# Altium schematic symbol library jlcpcb_2025_04_capacitors_extended_1206.schlib: 2503 symbols (part 1 of 14)
Pins are listed as number, name and electrical type; pins without a type are passive.

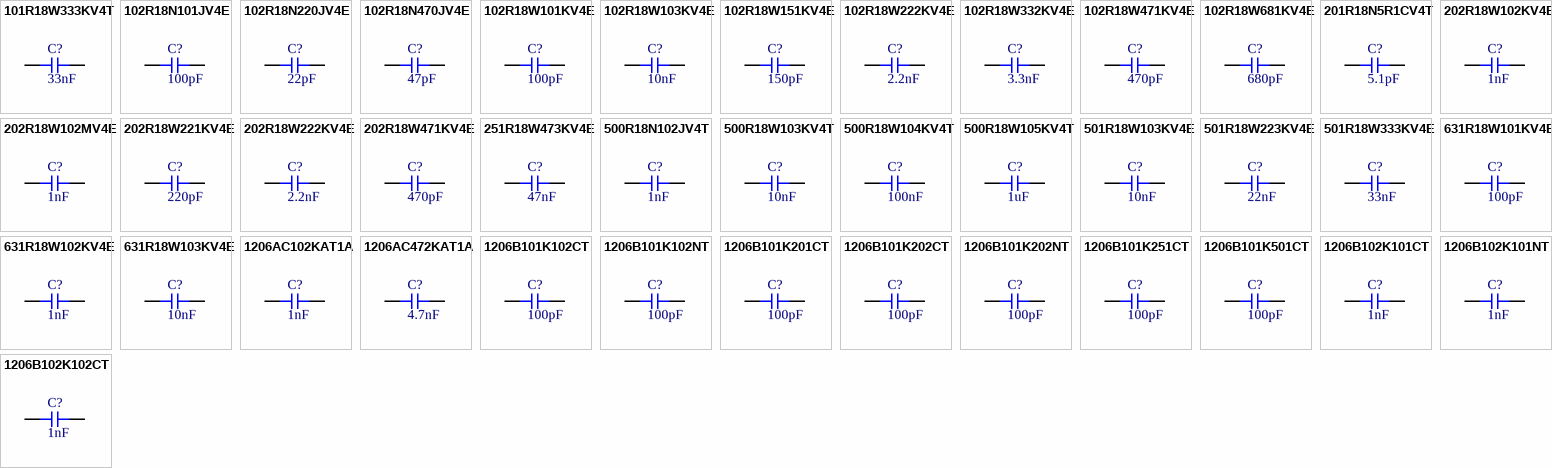
[diagram p0: symbols 101R18W333KV4T to 1206B102K102CT]

## 101R18W333KV4T
designator C?  Capacitance: 33nF  (hidden comment: *)
Capacitor, Ceramic (MLCC), 33nF, 100V, X7R, SMD 1206; Manufacturer: Johanson Dielectrics; Manufacturer Part Number: 101R18W333KV4T; Package Size: 1206; JLCPCB Basic Part: No; JLCPCB Part Number: C2917688; Supplier 1: LCSC; Category: Capacitors - MLCC; Supplier Part Number 1: C2917688; Voltage Rating: 100V; Temperature Coefficient: X7R; RoHS: Yes; ComponentLink1Description: Datasheet; ComponentLink1URL: https://wmsc.lcsc.com/wmsc/upload/file/pdf/v2/lcsc/2203311630_Johanson-Dielectrics-101R18W333KV4T_C2917688.pdf; ComponentLink2Description: JLCPCB Part URL; ComponentLink2URL: https://jlcpcb.com/partdetail/C2917688; ComponentLink3Description: LCSC Part URL; ComponentLink3URL: https://lcsc.com/product-detail/Multilayer-Ceramic-Capacitors-MLCC---SMD-SMT_Johanson-Dielectrics-Johanson-Dielectrics-101R18W333KV4T_C2917688.html
footprint CAP-1206 (1206 (3216M) Capacitor)
pins: 1, 2

## 102R18N101JV4E
designator C?  Capacitance: 100pF  (hidden comment: *)
Capacitor, Ceramic (MLCC), 100pF, ±5%, 1kV, C0G, ±5%, SMD 1206; Manufacturer: Johanson Dielectrics; Manufacturer Part Number: 102R18N101JV4E; Package Size: 1206; JLCPCB Basic Part: No; JLCPCB Part Number: C167435; Supplier 1: LCSC; Category: Capacitors - MLCC; Supplier Part Number 1: C167435; Tolerance: ±5%; Voltage Rating: 1kV; Temperature Coefficient: C0G; RoHS: Yes; ComponentLink1Description: Datasheet; ComponentLink1URL: https://wmsc.lcsc.com/wmsc/upload/file/pdf/v2/lcsc/2304140030_Johanson-Dielectrics-102R18N101JV4E_C167435.pdf; ComponentLink2Description: JLCPCB Part URL; ComponentLink2URL: https://jlcpcb.com/partdetail/C167435; ComponentLink3Description: LCSC Part URL; ComponentLink3URL: https://lcsc.com/product-detail/Multilayer-Ceramic-Capacitors-MLCC---SMD-SMT_Johanson-Dielectrics-Johanson-Dielectrics-102R18N101JV4E_C167435.html
footprint CAP-1206 (1206 (3216M) Capacitor)
pins: 1, 2

## 102R18N220JV4E
designator C?  Capacitance: 22pF  (hidden comment: *)
Capacitor, Ceramic (MLCC), 22pF, ±5%, 1kV, NP0, ±5%, SMD 1206; Manufacturer: Johanson Dielectrics; Manufacturer Part Number: 102R18N220JV4E; Package Size: 1206; JLCPCB Basic Part: No; JLCPCB Part Number: C173236; Supplier 1: LCSC; Category: Capacitors - MLCC; Supplier Part Number 1: C173236; Tolerance: ±5%; Voltage Rating: 1kV; Temperature Coefficient: NP0; RoHS: Yes; ComponentLink1Description: Datasheet; ComponentLink1URL: https://wmsc.lcsc.com/wmsc/upload/file/pdf/v2/lcsc/2304140030_Johanson-Dielectrics-102R18N220JV4E_C173236.pdf; ComponentLink2Description: JLCPCB Part URL; ComponentLink2URL: https://jlcpcb.com/partdetail/C173236; ComponentLink3Description: LCSC Part URL; ComponentLink3URL: https://lcsc.com/product-detail/Multilayer-Ceramic-Capacitors-MLCC---SMD-SMT_Johanson-Dielectrics-Johanson-Dielectrics-102R18N220JV4E_C173236.html
footprint CAP-1206 (1206 (3216M) Capacitor)
pins: 1, 2

## 102R18N470JV4E
designator C?  Capacitance: 47pF  (hidden comment: *)
Capacitor, Ceramic (MLCC), 47pF, ±5%, 1kV, NP0, ±5%, SMD 1206; Manufacturer: Johanson Dielectrics; Manufacturer Part Number: 102R18N470JV4E; Package Size: 1206; JLCPCB Basic Part: No; JLCPCB Part Number: C426616; Supplier 1: LCSC; Category: Capacitors - MLCC; Supplier Part Number 1: C426616; Tolerance: ±5%; Voltage Rating: 1kV; Temperature Coefficient: NP0; RoHS: Yes; ComponentLink1Description: Datasheet; ComponentLink1URL: https://wmsc.lcsc.com/wmsc/upload/file/pdf/v2/lcsc/2304140030_Johanson-Dielectrics-102R18N470JV4E_C426616.pdf; ComponentLink2Description: JLCPCB Part URL; ComponentLink2URL: https://jlcpcb.com/partdetail/C426616; ComponentLink3Description: LCSC Part URL; ComponentLink3URL: https://lcsc.com/product-detail/Multilayer-Ceramic-Capacitors-MLCC---SMD-SMT_Johanson-Dielectrics-Johanson-Dielectrics-102R18N470JV4E_C426616.html
footprint CAP-1206 (1206 (3216M) Capacitor)
pins: 1, 2

## 102R18W101KV4E
designator C?  Capacitance: 100pF  (hidden comment: *)
Capacitor, Ceramic (MLCC), 100pF, ±10%, 1kV, X7R, ±10%, SMD 1206; Manufacturer: Johanson Dielectrics; Manufacturer Part Number: 102R18W101KV4E; Package Size: 1206; JLCPCB Basic Part: No; JLCPCB Part Number: C430890; Supplier 1: LCSC; Category: Capacitors - MLCC; Supplier Part Number 1: C430890; Tolerance: ±10%; Voltage Rating: 1kV; Temperature Coefficient: X7R; RoHS: Yes; ComponentLink1Description: Datasheet; ComponentLink1URL: https://wmsc.lcsc.com/wmsc/upload/file/pdf/v2/lcsc/2304140030_Johanson-Dielectrics-102R18W101KV4E_C430890.pdf; ComponentLink2Description: JLCPCB Part URL; ComponentLink2URL: https://jlcpcb.com/partdetail/C430890; ComponentLink3Description: LCSC Part URL; ComponentLink3URL: https://lcsc.com/product-detail/Multilayer-Ceramic-Capacitors-MLCC---SMD-SMT_Johanson-Dielectrics-Johanson-Dielectrics-102R18W101KV4E_C430890.html
footprint CAP-1206 (1206 (3216M) Capacitor)
pins: 1, 2

## 102R18W103KV4E
designator C?  Capacitance: 10nF  (hidden comment: *)
Capacitor, Ceramic (MLCC), 10nF, ±10%, 1kV, X7R, ±10%, SMD 1206; Manufacturer: Johanson Dielectrics; Manufacturer Part Number: 102R18W103KV4E; Package Size: 1206; JLCPCB Basic Part: No; JLCPCB Part Number: C430993; Supplier 1: LCSC; Category: Capacitors - MLCC; Supplier Part Number 1: C430993; Tolerance: ±10%; Voltage Rating: 1kV; Temperature Coefficient: X7R; RoHS: Yes; ComponentLink1Description: Datasheet; ComponentLink1URL: https://wmsc.lcsc.com/wmsc/upload/file/pdf/v2/lcsc/2304140030_Johanson-Dielectrics-102R18W103KV4E_C430993.pdf; ComponentLink2Description: JLCPCB Part URL; ComponentLink2URL: https://jlcpcb.com/partdetail/C430993; ComponentLink3Description: LCSC Part URL; ComponentLink3URL: https://lcsc.com/product-detail/Multilayer-Ceramic-Capacitors-MLCC---SMD-SMT_Johanson-Dielectrics-Johanson-Dielectrics-102R18W103KV4E_C430993.html
footprint CAP-1206 (1206 (3216M) Capacitor)
pins: 1, 2

## 102R18W151KV4E
designator C?  Capacitance: 150pF  (hidden comment: *)
Capacitor, Ceramic (MLCC), 150pF, 1kV, X7R, SMD 1206; Manufacturer: Johanson Dielectrics; Manufacturer Part Number: 102R18W151KV4E; Package Size: 1206; JLCPCB Basic Part: No; JLCPCB Part Number: C2915790; Supplier 1: LCSC; Category: Capacitors - MLCC; Supplier Part Number 1: C2915790; Voltage Rating: 1kV; Temperature Coefficient: X7R; RoHS: Yes; ComponentLink1Description: Datasheet; ComponentLink1URL: https://wmsc.lcsc.com/wmsc/upload/file/pdf/v2/lcsc/2111161830_Johanson-Dielectrics-102R18W151KV4E_C2915790.pdf; ComponentLink2Description: JLCPCB Part URL; ComponentLink2URL: https://jlcpcb.com/partdetail/C2915790; ComponentLink3Description: LCSC Part URL; ComponentLink3URL: https://lcsc.com/product-detail/Multilayer-Ceramic-Capacitors-MLCC---SMD-SMT_Johanson-Dielectrics-Johanson-Dielectrics-102R18W151KV4E_C2915790.html
footprint CAP-1206 (1206 (3216M) Capacitor)
pins: 1, 2

## 102R18W222KV4E
designator C?  Capacitance: 2.2nF  (hidden comment: *)
Capacitor, Ceramic (MLCC), 2.2nF, ±10%, 1kV, X7R, ±10%, SMD 1206; Manufacturer: Johanson Dielectrics; Manufacturer Part Number: 102R18W222KV4E; Package Size: 1206; JLCPCB Basic Part: No; JLCPCB Part Number: C167434; Supplier 1: LCSC; Category: Capacitors - MLCC; Supplier Part Number 1: C167434; Tolerance: ±10%; Voltage Rating: 1kV; Temperature Coefficient: X7R; RoHS: Yes; ComponentLink1Description: Datasheet; ComponentLink1URL: https://wmsc.lcsc.com/wmsc/upload/file/pdf/v2/lcsc/2304140030_Johanson-Dielectrics-102R18W222KV4E_C167434.pdf; ComponentLink2Description: JLCPCB Part URL; ComponentLink2URL: https://jlcpcb.com/partdetail/C167434; ComponentLink3Description: LCSC Part URL; ComponentLink3URL: https://lcsc.com/product-detail/Multilayer-Ceramic-Capacitors-MLCC---SMD-SMT_Johanson-Dielectrics-Johanson-Dielectrics-102R18W222KV4E_C167434.html
footprint CAP-1206 (1206 (3216M) Capacitor)
pins: 1, 2

## 102R18W332KV4E
designator C?  Capacitance: 3.3nF  (hidden comment: *)
Capacitor, Ceramic (MLCC), 3.3nF, ±10%, 1kV, X7R, ±10%, SMD 1206; Manufacturer: Johanson Dielectrics; Manufacturer Part Number: 102R18W332KV4E; Package Size: 1206; JLCPCB Basic Part: No; JLCPCB Part Number: C427527; Supplier 1: LCSC; Category: Capacitors - MLCC; Supplier Part Number 1: C427527; Tolerance: ±10%; Voltage Rating: 1kV; Temperature Coefficient: X7R; RoHS: Yes; ComponentLink1Description: Datasheet; ComponentLink1URL: https://wmsc.lcsc.com/wmsc/upload/file/pdf/v2/lcsc/2304140030_Johanson-Dielectrics-102R18W332KV4E_C427527.pdf; ComponentLink2Description: JLCPCB Part URL; ComponentLink2URL: https://jlcpcb.com/partdetail/C427527; ComponentLink3Description: LCSC Part URL; ComponentLink3URL: https://lcsc.com/product-detail/Multilayer-Ceramic-Capacitors-MLCC---SMD-SMT_Johanson-Dielectrics-Johanson-Dielectrics-102R18W332KV4E_C427527.html
footprint CAP-1206 (1206 (3216M) Capacitor)
pins: 1, 2

## 102R18W471KV4E
designator C?  Capacitance: 470pF  (hidden comment: *)
Capacitor, Ceramic (MLCC), 470pF, ±10%, 1kV, X7R, ±10%, SMD 1206; Manufacturer: Johanson Dielectrics; Manufacturer Part Number: 102R18W471KV4E; Package Size: 1206; JLCPCB Basic Part: No; JLCPCB Part Number: C2915795; Supplier 1: LCSC; Category: Capacitors - MLCC; Supplier Part Number 1: C2915795; Tolerance: ±10%; Voltage Rating: 1kV; Temperature Coefficient: X7R; RoHS: Yes; ComponentLink1Description: Datasheet; ComponentLink1URL: https://wmsc.lcsc.com/wmsc/upload/file/pdf/v2/lcsc/2111161830_Johanson-Dielectrics-102R18W471KV4E_C2915795.pdf; ComponentLink2Description: JLCPCB Part URL; ComponentLink2URL: https://jlcpcb.com/partdetail/C2915795; ComponentLink3Description: LCSC Part URL; ComponentLink3URL: https://lcsc.com/product-detail/Multilayer-Ceramic-Capacitors-MLCC---SMD-SMT_Johanson-Dielectrics-Johanson-Dielectrics-102R18W471KV4E_C2915795.html
footprint CAP-1206 (1206 (3216M) Capacitor)
pins: 1, 2

## 102R18W681KV4E
designator C?  Capacitance: 680pF  (hidden comment: *)
Capacitor, Ceramic (MLCC), 680pF, ±10%, 1kV, X7R, ±10%, SMD 1206; Manufacturer: Johanson Dielectrics; Manufacturer Part Number: 102R18W681KV4E; Package Size: 1206; JLCPCB Basic Part: No; JLCPCB Part Number: C427526; Supplier 1: LCSC; Category: Capacitors - MLCC; Supplier Part Number 1: C427526; Tolerance: ±10%; Voltage Rating: 1kV; Temperature Coefficient: X7R; RoHS: Yes; ComponentLink1Description: Datasheet; ComponentLink1URL: https://wmsc.lcsc.com/wmsc/upload/file/pdf/v2/lcsc/2304140030_Johanson-Dielectrics-102R18W681KV4E_C427526.pdf; ComponentLink2Description: JLCPCB Part URL; ComponentLink2URL: https://jlcpcb.com/partdetail/C427526; ComponentLink3Description: LCSC Part URL; ComponentLink3URL: https://lcsc.com/product-detail/Multilayer-Ceramic-Capacitors-MLCC---SMD-SMT_Johanson-Dielectrics-Johanson-Dielectrics-102R18W681KV4E_C427526.html
footprint CAP-1206 (1206 (3216M) Capacitor)
pins: 1, 2

## 201R18N5R1CV4T
designator C?  Capacitance: 5.1pF  (hidden comment: *)
Capacitor, Ceramic (MLCC), 5.1pF, 200V, NP0, SMD 1206; Manufacturer: Johanson Dielectrics; Manufacturer Part Number: 201R18N5R1CV4T; Package Size: 1206; JLCPCB Basic Part: No; JLCPCB Part Number: C431011; Supplier 1: LCSC; Category: Capacitors - MLCC; Supplier Part Number 1: C431011; Voltage Rating: 200V; Temperature Coefficient: NP0; RoHS: Yes; ComponentLink1Description: Datasheet; ComponentLink1URL: https://wmsc.lcsc.com/wmsc/upload/file/pdf/v2/lcsc/2304140030_Johanson-Dielectrics-201R18N5R1CV4T_C431011.pdf; ComponentLink2Description: JLCPCB Part URL; ComponentLink2URL: https://jlcpcb.com/partdetail/C431011; ComponentLink3Description: LCSC Part URL; ComponentLink3URL: https://lcsc.com/product-detail/Multilayer-Ceramic-Capacitors-MLCC---SMD-SMT_Johanson-Dielectrics-Johanson-Dielectrics-201R18N5R1CV4T_C431011.html
footprint CAP-1206 (1206 (3216M) Capacitor)
pins: 1, 2

## 202R18W102KV4E
designator C?  Capacitance: 1nF  (hidden comment: *)
Capacitor, Ceramic (MLCC), 1nF, ±10%, 2kV, X7R, ±10%, SMD 1206; Manufacturer: Johanson Dielectrics; Manufacturer Part Number: 202R18W102KV4E; Package Size: 1206; JLCPCB Basic Part: No; JLCPCB Part Number: C173242; Supplier 1: LCSC; Category: Capacitors - MLCC; Supplier Part Number 1: C173242; Tolerance: ±10%; Voltage Rating: 2kV; Temperature Coefficient: X7R; RoHS: Yes; ComponentLink1Description: Datasheet; ComponentLink1URL: https://wmsc.lcsc.com/wmsc/upload/file/pdf/v2/lcsc/2304140030_Johanson-Dielectrics-202R18W102KV4E_C173242.pdf; ComponentLink2Description: JLCPCB Part URL; ComponentLink2URL: https://jlcpcb.com/partdetail/C173242; ComponentLink3Description: LCSC Part URL; ComponentLink3URL: https://lcsc.com/product-detail/Multilayer-Ceramic-Capacitors-MLCC---SMD-SMT_Johanson-Dielectrics-Johanson-Dielectrics-202R18W102KV4E_C173242.html
footprint CAP-1206 (1206 (3216M) Capacitor)
pins: 1, 2

## 202R18W102MV4E
designator C?  Capacitance: 1nF  (hidden comment: *)
Capacitor, Ceramic (MLCC), 1nF, ±20%, 2kV, X7R, ±20%, SMD 1206; Manufacturer: Johanson Dielectrics; Manufacturer Part Number: 202R18W102MV4E; Package Size: 1206; JLCPCB Basic Part: No; JLCPCB Part Number: C167433; Supplier 1: LCSC; Category: Capacitors - MLCC; Supplier Part Number 1: C167433; Tolerance: ±20%; Voltage Rating: 2kV; Temperature Coefficient: X7R; RoHS: Yes; ComponentLink1Description: Datasheet; ComponentLink1URL: https://wmsc.lcsc.com/wmsc/upload/file/pdf/v2/lcsc/2304140030_Johanson-Dielectrics-202R18W102MV4E_C167433.pdf; ComponentLink2Description: JLCPCB Part URL; ComponentLink2URL: https://jlcpcb.com/partdetail/C167433; ComponentLink3Description: LCSC Part URL; ComponentLink3URL: https://lcsc.com/product-detail/Multilayer-Ceramic-Capacitors-MLCC---SMD-SMT_Johanson-Dielectrics-Johanson-Dielectrics-202R18W102MV4E_C167433.html
footprint CAP-1206 (1206 (3216M) Capacitor)
pins: 1, 2

## 202R18W221KV4E
designator C?  Capacitance: 220pF  (hidden comment: *)
Capacitor, Ceramic (MLCC), 220pF, ±10%, 2kV, X7R, ±10%, SMD 1206; Manufacturer: Johanson Dielectrics; Manufacturer Part Number: 202R18W221KV4E; Package Size: 1206; JLCPCB Basic Part: No; JLCPCB Part Number: C173233; Supplier 1: LCSC; Category: Capacitors - MLCC; Supplier Part Number 1: C173233; Tolerance: ±10%; Voltage Rating: 2kV; Temperature Coefficient: X7R; RoHS: Yes; ComponentLink1Description: Datasheet; ComponentLink1URL: https://wmsc.lcsc.com/wmsc/upload/file/pdf/v2/lcsc/2304140030_Johanson-Dielectrics-202R18W221KV4E_C173233.pdf; ComponentLink2Description: JLCPCB Part URL; ComponentLink2URL: https://jlcpcb.com/partdetail/C173233; ComponentLink3Description: LCSC Part URL; ComponentLink3URL: https://lcsc.com/product-detail/Multilayer-Ceramic-Capacitors-MLCC---SMD-SMT_Johanson-Dielectrics-Johanson-Dielectrics-202R18W221KV4E_C173233.html
footprint CAP-1206 (1206 (3216M) Capacitor)
pins: 1, 2

## 202R18W222KV4E
designator C?  Capacitance: 2.2nF  (hidden comment: *)
Capacitor, Ceramic (MLCC), 2.2nF, ±10%, 2kV, X7R, ±10%, SMD 1206; Manufacturer: Johanson Dielectrics; Manufacturer Part Number: 202R18W222KV4E; Package Size: 1206; JLCPCB Basic Part: No; JLCPCB Part Number: C173213; Supplier 1: LCSC; Category: Capacitors - MLCC; Supplier Part Number 1: C173213; Tolerance: ±10%; Voltage Rating: 2kV; Temperature Coefficient: X7R; RoHS: Yes; ComponentLink1Description: Datasheet; ComponentLink1URL: https://wmsc.lcsc.com/wmsc/upload/file/pdf/v2/lcsc/2304140030_Johanson-Dielectrics-202R18W222KV4E_C173213.pdf; ComponentLink2Description: JLCPCB Part URL; ComponentLink2URL: https://jlcpcb.com/partdetail/C173213; ComponentLink3Description: LCSC Part URL; ComponentLink3URL: https://lcsc.com/product-detail/Multilayer-Ceramic-Capacitors-MLCC---SMD-SMT_Johanson-Dielectrics-Johanson-Dielectrics-202R18W222KV4E_C173213.html
footprint CAP-1206 (1206 (3216M) Capacitor)
pins: 1, 2

## 202R18W471KV4E
designator C?  Capacitance: 470pF  (hidden comment: *)
Capacitor, Ceramic (MLCC), 470pF, ±10%, 2kV, X7R, ±10%, SMD 1206; Manufacturer: Johanson Dielectrics; Manufacturer Part Number: 202R18W471KV4E; Package Size: 1206; JLCPCB Basic Part: No; JLCPCB Part Number: C167388; Supplier 1: LCSC; Category: Capacitors - MLCC; Supplier Part Number 1: C167388; Tolerance: ±10%; Voltage Rating: 2kV; Temperature Coefficient: X7R; RoHS: Yes; ComponentLink1Description: Datasheet; ComponentLink1URL: https://wmsc.lcsc.com/wmsc/upload/file/pdf/v2/lcsc/2304140030_Johanson-Dielectrics-202R18W471KV4E_C167388.pdf; ComponentLink2Description: JLCPCB Part URL; ComponentLink2URL: https://jlcpcb.com/partdetail/C167388; ComponentLink3Description: LCSC Part URL; ComponentLink3URL: https://lcsc.com/product-detail/Multilayer-Ceramic-Capacitors-MLCC---SMD-SMT_Johanson-Dielectrics-Johanson-Dielectrics-202R18W471KV4E_C167388.html
footprint CAP-1206 (1206 (3216M) Capacitor)
pins: 1, 2

## 251R18W473KV4E
designator C?  Capacitance: 47nF  (hidden comment: *)
Capacitor, Ceramic (MLCC), 47nF, ±10%, 250V, X7R, ±10%, SMD 1206; Manufacturer: Johanson Dielectrics; Manufacturer Part Number: 251R18W473KV4E; Package Size: 1206; JLCPCB Basic Part: No; JLCPCB Part Number: C173193; Supplier 1: LCSC; Category: Capacitors - MLCC; Supplier Part Number 1: C173193; Tolerance: ±10%; Voltage Rating: 250V; Temperature Coefficient: X7R; RoHS: Yes; ComponentLink1Description: Datasheet; ComponentLink1URL: https://wmsc.lcsc.com/wmsc/upload/file/pdf/v2/lcsc/2111161730_Johanson-Dielectrics-251R18W473KV4E_C173193.pdf; ComponentLink2Description: JLCPCB Part URL; ComponentLink2URL: https://jlcpcb.com/partdetail/C173193; ComponentLink3Description: LCSC Part URL; ComponentLink3URL: https://lcsc.com/product-detail/Multilayer-Ceramic-Capacitors-MLCC---SMD-SMT_Johanson-Dielectrics-Johanson-Dielectrics-251R18W473KV4E_C173193.html
footprint CAP-1206 (1206 (3216M) Capacitor)
pins: 1, 2

## 500R18N102JV4T
designator C?  Capacitance: 1nF  (hidden comment: *)
Capacitor, Ceramic (MLCC), 1nF, ±5%, 50V, NP0, ±5%, SMD 1206; Manufacturer: Johanson Dielectrics; Manufacturer Part Number: 500R18N102JV4T; Package Size: 1206; JLCPCB Basic Part: No; JLCPCB Part Number: C431634; Supplier 1: LCSC; Category: Capacitors - MLCC; Supplier Part Number 1: C431634; Tolerance: ±5%; Voltage Rating: 50V; Temperature Coefficient: NP0; RoHS: Yes; ComponentLink1Description: Datasheet; ComponentLink1URL: https://wmsc.lcsc.com/wmsc/upload/file/pdf/v2/lcsc/2304140030_Johanson-Dielectrics-500R18N102JV4T_C431634.pdf; ComponentLink2Description: JLCPCB Part URL; ComponentLink2URL: https://jlcpcb.com/partdetail/C431634; ComponentLink3Description: LCSC Part URL; ComponentLink3URL: https://lcsc.com/product-detail/Multilayer-Ceramic-Capacitors-MLCC---SMD-SMT_Johanson-Dielectrics-Johanson-Dielectrics-500R18N102JV4T_C431634.html
footprint CAP-1206 (1206 (3216M) Capacitor)
pins: 1, 2

## 500R18W103KV4T
designator C?  Capacitance: 10nF  (hidden comment: *)
Capacitor, Ceramic (MLCC), 10nF, ±10%, 50V, X7R, ±10%, SMD 1206; Manufacturer: Johanson Dielectrics; Manufacturer Part Number: 500R18W103KV4T; Package Size: 1206; JLCPCB Basic Part: No; JLCPCB Part Number: C431006; Supplier 1: LCSC; Category: Capacitors - MLCC; Supplier Part Number 1: C431006; Tolerance: ±10%; Voltage Rating: 50V; Temperature Coefficient: X7R; RoHS: Yes; ComponentLink1Description: Datasheet; ComponentLink1URL: https://wmsc.lcsc.com/wmsc/upload/file/pdf/v2/lcsc/2304140030_Johanson-Dielectrics-500R18W103KV4T_C431006.pdf; ComponentLink2Description: JLCPCB Part URL; ComponentLink2URL: https://jlcpcb.com/partdetail/C431006; ComponentLink3Description: LCSC Part URL; ComponentLink3URL: https://lcsc.com/product-detail/Multilayer-Ceramic-Capacitors-MLCC---SMD-SMT_Johanson-Dielectrics-Johanson-Dielectrics-500R18W103KV4T_C431006.html
footprint CAP-1206 (1206 (3216M) Capacitor)
pins: 1, 2

## 500R18W104KV4T
designator C?  Capacitance: 100nF  (hidden comment: *)
Capacitor, Ceramic (MLCC), 100nF, ±10%, 50V, X7R, ±10%, SMD 1206; Manufacturer: Johanson Dielectrics; Manufacturer Part Number: 500R18W104KV4T; Package Size: 1206; JLCPCB Basic Part: No; JLCPCB Part Number: C431007; Supplier 1: LCSC; Category: Capacitors - MLCC; Supplier Part Number 1: C431007; Tolerance: ±10%; Voltage Rating: 50V; Temperature Coefficient: X7R; RoHS: Yes; ComponentLink1Description: Datasheet; ComponentLink1URL: https://wmsc.lcsc.com/wmsc/upload/file/pdf/v2/lcsc/2304140030_Johanson-Dielectrics-500R18W104KV4T_C431007.pdf; ComponentLink2Description: JLCPCB Part URL; ComponentLink2URL: https://jlcpcb.com/partdetail/C431007; ComponentLink3Description: LCSC Part URL; ComponentLink3URL: https://lcsc.com/product-detail/Multilayer-Ceramic-Capacitors-MLCC---SMD-SMT_Johanson-Dielectrics-Johanson-Dielectrics-500R18W104KV4T_C431007.html
footprint CAP-1206 (1206 (3216M) Capacitor)
pins: 1, 2

## 500R18W105KV4T
designator C?  Capacitance: 1uF  (hidden comment: *)
Capacitor, Ceramic (MLCC), 1uF, 50V, X7R, SMD 1206; Manufacturer: Johanson Dielectrics; Manufacturer Part Number: 500R18W105KV4T; Package Size: 1206; JLCPCB Basic Part: No; JLCPCB Part Number: C2917761; Supplier 1: LCSC; Category: Capacitors - MLCC; Supplier Part Number 1: C2917761; Voltage Rating: 50V; Temperature Coefficient: X7R; RoHS: Yes; ComponentLink1Description: Datasheet; ComponentLink1URL: https://wmsc.lcsc.com/wmsc/upload/file/pdf/v2/lcsc/2203311630_Johanson-Dielectrics-500R18W105KV4T_C2917761.pdf; ComponentLink2Description: JLCPCB Part URL; ComponentLink2URL: https://jlcpcb.com/partdetail/C2917761; ComponentLink3Description: LCSC Part URL; ComponentLink3URL: https://lcsc.com/product-detail/Multilayer-Ceramic-Capacitors-MLCC---SMD-SMT_Johanson-Dielectrics-Johanson-Dielectrics-500R18W105KV4T_C2917761.html
footprint CAP-1206 (1206 (3216M) Capacitor)
pins: 1, 2

## 501R18W103KV4E
designator C?  Capacitance: 10nF  (hidden comment: *)
Capacitor, Ceramic (MLCC), 10nF, ±10%, 500V, X7R, ±10%, SMD 1206; Manufacturer: Johanson Dielectrics; Manufacturer Part Number: 501R18W103KV4E; Package Size: 1206; JLCPCB Basic Part: No; JLCPCB Part Number: C2168125; Supplier 1: LCSC; Category: Capacitors - MLCC; Supplier Part Number 1: C2168125; Tolerance: ±10%; Voltage Rating: 500V; Temperature Coefficient: X7R; RoHS: Yes; ComponentLink1Description: Datasheet; ComponentLink1URL: https://wmsc.lcsc.com/wmsc/upload/file/pdf/v2/lcsc/2304140030_Johanson-Dielectrics-501R18W103KV4E_C2168125.pdf; ComponentLink2Description: JLCPCB Part URL; ComponentLink2URL: https://jlcpcb.com/partdetail/C2168125; ComponentLink3Description: LCSC Part URL; ComponentLink3URL: https://lcsc.com/product-detail/Multilayer-Ceramic-Capacitors-MLCC---SMD-SMT_Johanson-Dielectrics-Johanson-Dielectrics-501R18W103KV4E_C2168125.html
footprint CAP-1206 (1206 (3216M) Capacitor)
pins: 1, 2

## 501R18W223KV4E
designator C?  Capacitance: 22nF  (hidden comment: *)
Capacitor, Ceramic (MLCC), 22nF, ±10%, 500V, X7R, ±10%, SMD 1206; Manufacturer: Johanson Dielectrics; Manufacturer Part Number: 501R18W223KV4E; Package Size: 1206; JLCPCB Basic Part: No; JLCPCB Part Number: C426618; Supplier 1: LCSC; Category: Capacitors - MLCC; Supplier Part Number 1: C426618; Tolerance: ±10%; Voltage Rating: 500V; Temperature Coefficient: X7R; RoHS: Yes; ComponentLink1Description: Datasheet; ComponentLink1URL: https://wmsc.lcsc.com/wmsc/upload/file/pdf/v2/lcsc/2304140030_Johanson-Dielectrics-501R18W223KV4E_C426618.pdf; ComponentLink2Description: JLCPCB Part URL; ComponentLink2URL: https://jlcpcb.com/partdetail/C426618; ComponentLink3Description: LCSC Part URL; ComponentLink3URL: https://lcsc.com/product-detail/Multilayer-Ceramic-Capacitors-MLCC---SMD-SMT_Johanson-Dielectrics-Johanson-Dielectrics-501R18W223KV4E_C426618.html
footprint CAP-1206 (1206 (3216M) Capacitor)
pins: 1, 2

## 501R18W333KV4E
designator C?  Capacitance: 33nF  (hidden comment: *)
Capacitor, Ceramic (MLCC), 33nF, ±10%, 500V, X7R, ±10%, SMD 1206; Manufacturer: Johanson Dielectrics; Manufacturer Part Number: 501R18W333KV4E; Package Size: 1206; JLCPCB Basic Part: No; JLCPCB Part Number: C427529; Supplier 1: LCSC; Category: Capacitors - MLCC; Supplier Part Number 1: C427529; Tolerance: ±10%; Voltage Rating: 500V; Temperature Coefficient: X7R; RoHS: Yes; ComponentLink1Description: Datasheet; ComponentLink1URL: https://wmsc.lcsc.com/wmsc/upload/file/pdf/v2/lcsc/2304140030_Johanson-Dielectrics-501R18W333KV4E_C427529.pdf; ComponentLink2Description: JLCPCB Part URL; ComponentLink2URL: https://jlcpcb.com/partdetail/C427529; ComponentLink3Description: LCSC Part URL; ComponentLink3URL: https://lcsc.com/product-detail/Multilayer-Ceramic-Capacitors-MLCC---SMD-SMT_Johanson-Dielectrics-Johanson-Dielectrics-501R18W333KV4E_C427529.html
footprint CAP-1206 (1206 (3216M) Capacitor)
pins: 1, 2

## 631R18W101KV4E
designator C?  Capacitance: 100pF  (hidden comment: *)
Capacitor, Ceramic (MLCC), 100pF, ±10%, 630V, X7R, ±10%, SMD 1206; Manufacturer: Johanson Dielectrics; Manufacturer Part Number: 631R18W101KV4E; Package Size: 1206; JLCPCB Basic Part: No; JLCPCB Part Number: C430889; Supplier 1: LCSC; Category: Capacitors - MLCC; Supplier Part Number 1: C430889; Tolerance: ±10%; Voltage Rating: 630V; Temperature Coefficient: X7R; RoHS: Yes; ComponentLink1Description: Datasheet; ComponentLink1URL: https://wmsc.lcsc.com/wmsc/upload/file/pdf/v2/lcsc/2304140030_Johanson-Dielectrics-631R18W101KV4E_C430889.pdf; ComponentLink2Description: JLCPCB Part URL; ComponentLink2URL: https://jlcpcb.com/partdetail/C430889; ComponentLink3Description: LCSC Part URL; ComponentLink3URL: https://lcsc.com/product-detail/Multilayer-Ceramic-Capacitors-MLCC---SMD-SMT_Johanson-Dielectrics-Johanson-Dielectrics-631R18W101KV4E_C430889.html
footprint CAP-1206 (1206 (3216M) Capacitor)
pins: 1, 2

## 631R18W102KV4E
designator C?  Capacitance: 1nF  (hidden comment: *)
Capacitor, Ceramic (MLCC), 1nF, ±10%, 630V, X7R, ±10%, SMD 1206; Manufacturer: Johanson Dielectrics; Manufacturer Part Number: 631R18W102KV4E; Package Size: 1206; JLCPCB Basic Part: No; JLCPCB Part Number: C430891; Supplier 1: LCSC; Category: Capacitors - MLCC; Supplier Part Number 1: C430891; Tolerance: ±10%; Voltage Rating: 630V; Temperature Coefficient: X7R; RoHS: Yes; ComponentLink1Description: Datasheet; ComponentLink1URL: https://wmsc.lcsc.com/wmsc/upload/file/pdf/v2/lcsc/2304140030_Johanson-Dielectrics-631R18W102KV4E_C430891.pdf; ComponentLink2Description: JLCPCB Part URL; ComponentLink2URL: https://jlcpcb.com/partdetail/C430891; ComponentLink3Description: LCSC Part URL; ComponentLink3URL: https://lcsc.com/product-detail/Multilayer-Ceramic-Capacitors-MLCC---SMD-SMT_Johanson-Dielectrics-Johanson-Dielectrics-631R18W102KV4E_C430891.html
footprint CAP-1206 (1206 (3216M) Capacitor)
pins: 1, 2

## 631R18W103KV4E
designator C?  Capacitance: 10nF  (hidden comment: *)
Capacitor, Ceramic (MLCC), 10nF, ±10%, 630V, X7R, ±10%, SMD 1206; Manufacturer: Johanson Dielectrics; Manufacturer Part Number: 631R18W103KV4E; Package Size: 1206; JLCPCB Basic Part: No; JLCPCB Part Number: C430992; Supplier 1: LCSC; Category: Capacitors - MLCC; Supplier Part Number 1: C430992; Tolerance: ±10%; Voltage Rating: 630V; Temperature Coefficient: X7R; RoHS: Yes; ComponentLink1Description: Datasheet; ComponentLink1URL: https://wmsc.lcsc.com/wmsc/upload/file/pdf/v2/lcsc/2304140030_Johanson-Dielectrics-631R18W103KV4E_C430992.pdf; ComponentLink2Description: JLCPCB Part URL; ComponentLink2URL: https://jlcpcb.com/partdetail/C430992; ComponentLink3Description: LCSC Part URL; ComponentLink3URL: https://lcsc.com/product-detail/Multilayer-Ceramic-Capacitors-MLCC---SMD-SMT_Johanson-Dielectrics-Johanson-Dielectrics-631R18W103KV4E_C430992.html
footprint CAP-1206 (1206 (3216M) Capacitor)
pins: 1, 2

## 1206AC102KAT1A
designator C?  Capacitance: 1nF  (hidden comment: *)
Capacitor, Ceramic (MLCC), 1nF, ±10%, 1kV, X7R, ±10%, SMD 1206; Manufacturer: AVX; Manufacturer Part Number: 1206AC102KAT1A; Package Size: 1206; JLCPCB Basic Part: No; JLCPCB Part Number: C597538; Supplier 1: LCSC; Category: Capacitors - MLCC; Supplier Part Number 1: C597538; Tolerance: ±10%; Voltage Rating: 1kV; Temperature Coefficient: X7R; RoHS: Yes; ComponentLink1Description: Datasheet; ComponentLink1URL: https://wmsc.lcsc.com/wmsc/upload/file/pdf/v2/lcsc/2304140030_Kyocera-AVX-1206AC102KAT1A_C597538.pdf; ComponentLink2Description: JLCPCB Part URL; ComponentLink2URL: https://jlcpcb.com/partdetail/C597538; ComponentLink3Description: LCSC Part URL; ComponentLink3URL: https://lcsc.com/product-detail/Multilayer-Ceramic-Capacitors-MLCC---SMD-SMT_Kyocera-AVX-Kyocera-AVX-1206AC102KAT1A_C597538.html
footprint CAP-1206 (1206 (3216M) Capacitor)
pins: 1, 2

## 1206AC472KAT1A
designator C?  Capacitance: 4.7nF  (hidden comment: *)
Capacitor, Ceramic (MLCC), 4.7nF, ±10%, 1kV, X7R, ±10%, SMD 1206; Manufacturer: Kyocera AVX; Manufacturer Part Number: 1206AC472KAT1A; Package Size: 1206; JLCPCB Basic Part: No; JLCPCB Part Number: C2167687; Supplier 1: LCSC; Category: Capacitors - MLCC; Supplier Part Number 1: C2167687; Tolerance: ±10%; Voltage Rating: 1kV; Temperature Coefficient: X7R; RoHS: Yes; ComponentLink1Description: Datasheet; ComponentLink1URL: https://wmsc.lcsc.com/wmsc/upload/file/pdf/v2/lcsc/2309151035_Kyocera-AVX-1206AC472KAT1A_C2167687.pdf; ComponentLink2Description: JLCPCB Part URL; ComponentLink2URL: https://jlcpcb.com/partdetail/C2167687; ComponentLink3Description: LCSC Part URL; ComponentLink3URL: https://lcsc.com/product-detail/Multilayer-Ceramic-Capacitors-MLCC---SMD-SMT_Kyocera-AVX-Kyocera-AVX-1206AC472KAT1A_C2167687.html
footprint CAP-1206 (1206 (3216M) Capacitor)
pins: 1, 2

## 1206B101K102CT
designator C?  Capacitance: 100pF  (hidden comment: *)
Capacitor, Ceramic (MLCC), 100pF, ±10%, 1kV, X7R, ±10%, SMD 1206; Manufacturer: Walsin Tech Corp; Manufacturer Part Number: 1206B101K102CT; Package Size: 1206; JLCPCB Basic Part: No; JLCPCB Part Number: C296113; Supplier 1: LCSC; Category: Capacitors - MLCC; Supplier Part Number 1: C296113; Tolerance: ±10%; Voltage Rating: 1kV; Temperature Coefficient: X7R; RoHS: Yes; ComponentLink1Description: Datasheet; ComponentLink1URL: https://wmsc.lcsc.com/wmsc/upload/file/pdf/v2/lcsc/2304140030_Walsin-Tech-Corp-1206B101K102CT_C296113.pdf; ComponentLink2Description: JLCPCB Part URL; ComponentLink2URL: https://jlcpcb.com/partdetail/C296113; ComponentLink3Description: LCSC Part URL; ComponentLink3URL: https://lcsc.com/product-detail/Multilayer-Ceramic-Capacitors-MLCC---SMD-SMT_Walsin-Tech-Corp-Walsin-Tech-Corp-1206B101K102CT_C296113.html
footprint CAP-1206 (1206 (3216M) Capacitor)
pins: 1, 2

## 1206B101K102NT
designator C?  Capacitance: 100pF  (hidden comment: *)
Capacitor, Ceramic (MLCC), 100pF, ±10%, 1kV, X7R, ±10%, SMD 1206; Manufacturer: FH (Guangdong Fenghua Advanced Tech); Manufacturer Part Number: 1206B101K102NT; Package Size: 1206; JLCPCB Basic Part: No; JLCPCB Part Number: C2983025; Supplier 1: LCSC; Category: Capacitors - MLCC; Supplier Part Number 1: C2983025; Tolerance: ±10%; Voltage Rating: 1kV; Temperature Coefficient: X7R; RoHS: Yes; ComponentLink1Description: Datasheet; ComponentLink1URL: https://wmsc.lcsc.com/wmsc/upload/file/pdf/v2/lcsc/2212021230_FH--Guangdong-Fenghua-Advanced-Tech-1206B101K102NT_C2983025.pdf; ComponentLink2Description: JLCPCB Part URL; ComponentLink2URL: https://jlcpcb.com/partdetail/C2983025; ComponentLink3Description: LCSC Part URL; ComponentLink3URL: https://lcsc.com/product-detail/Multilayer-Ceramic-Capacitors-MLCC---SMD-SMT_FH-Guangdong-Fenghua-Advanced-Tech-FH-Guangdong-Fenghua-Advanced-Tech-1206B101K102NT_C2983025.html
footprint CAP-1206 (1206 (3216M) Capacitor)
pins: 1, 2

## 1206B101K201CT
designator C?  Capacitance: 100pF  (hidden comment: *)
Capacitor, Ceramic (MLCC), 100pF, ±10%, 200V, X7R, ±10%, SMD 1206; Manufacturer: Walsin Tech Corp; Manufacturer Part Number: 1206B101K201CT; Package Size: 1206; JLCPCB Basic Part: No; JLCPCB Part Number: C3844264; Supplier 1: LCSC; Category: Capacitors - MLCC; Supplier Part Number 1: C3844264; Tolerance: ±10%; Voltage Rating: 200V; Temperature Coefficient: X7R; RoHS: Yes; ComponentLink1Description: Datasheet; ComponentLink1URL: https://wmsc.lcsc.com/wmsc/upload/file/pdf/v2/lcsc/2309201537_Walsin-Tech-Corp-1206B101K201CT_C3844264.pdf; ComponentLink2Description: JLCPCB Part URL; ComponentLink2URL: https://jlcpcb.com/partdetail/C3844264; ComponentLink3Description: LCSC Part URL; ComponentLink3URL: https://lcsc.com/product-detail/Multilayer-Ceramic-Capacitors-MLCC---SMD-SMT_Walsin-Tech-Corp-Walsin-Tech-Corp-1206B101K201CT_C3844264.html
footprint CAP-1206 (1206 (3216M) Capacitor)
pins: 1, 2

## 1206B101K202CT
designator C?  Capacitance: 100pF  (hidden comment: *)
Capacitor, Ceramic (MLCC), 100pF, ±10%, 2kV, X7R, ±10%, SMD 1206; Manufacturer: Walsin Tech Corp; Manufacturer Part Number: 1206B101K202CT; Package Size: 1206; JLCPCB Basic Part: No; JLCPCB Part Number: C525504; Supplier 1: LCSC; Category: Capacitors - MLCC; Supplier Part Number 1: C525504; Tolerance: ±10%; Voltage Rating: 2kV; Temperature Coefficient: X7R; RoHS: Yes; ComponentLink1Description: Datasheet; ComponentLink1URL: https://wmsc.lcsc.com/wmsc/upload/file/pdf/v2/lcsc/2304140030_Walsin-Tech-Corp-1206B101K202CT_C525504.pdf; ComponentLink2Description: JLCPCB Part URL; ComponentLink2URL: https://jlcpcb.com/partdetail/C525504; ComponentLink3Description: LCSC Part URL; ComponentLink3URL: https://lcsc.com/product-detail/Multilayer-Ceramic-Capacitors-MLCC---SMD-SMT_Walsin-Tech-Corp-Walsin-Tech-Corp-1206B101K202CT_C525504.html
footprint CAP-1206 (1206 (3216M) Capacitor)
pins: 1, 2

## 1206B101K202NT
designator C?  Capacitance: 100pF  (hidden comment: *)
Capacitor, Ceramic (MLCC), 100pF, ±10%, 2kV, X7R, ±10%, SMD 1206; Manufacturer: FH-BK(Guangdong Fenghua Bangke Elec); Manufacturer Part Number: 1206B101K202NT; Package Size: 1206; JLCPCB Basic Part: No; JLCPCB Part Number: C2961015; Supplier 1: LCSC; Category: Capacitors - MLCC; Supplier Part Number 1: C2961015; Tolerance: ±10%; Voltage Rating: 2kV; Temperature Coefficient: X7R; RoHS: Yes; ComponentLink1Description: Datasheet; ComponentLink1URL: https://wmsc.lcsc.com/wmsc/upload/file/pdf/v2/lcsc/2201191030_FH-BK-Guangdong-Fenghua-Bangke-Elec-1206B101K202NT_C2961015.pdf; ComponentLink2Description: JLCPCB Part URL; ComponentLink2URL: https://jlcpcb.com/partdetail/C2961015; ComponentLink3Description: LCSC Part URL; ComponentLink3URL: https://lcsc.com/product-detail/Multilayer-Ceramic-Capacitors-MLCC---SMD-SMT_FH-BKGuangdong-Fenghua-Bangke-Elec-FH-BKGuangdong-Fenghua-Bangke-Elec-1206B101K202NT_C2961015.html
footprint CAP-1206 (1206 (3216M) Capacitor)
pins: 1, 2

## 1206B101K251CT
designator C?  Capacitance: 100pF  (hidden comment: *)
Capacitor, Ceramic (MLCC), 100pF, ±10%, 250V, X7R, ±10%, SMD 1206; Manufacturer: Walsin Tech Corp; Manufacturer Part Number: 1206B101K251CT; Package Size: 1206; JLCPCB Basic Part: No; JLCPCB Part Number: C237164; Supplier 1: LCSC; Category: Capacitors - MLCC; Supplier Part Number 1: C237164; Tolerance: ±10%; Voltage Rating: 250V; Temperature Coefficient: X7R; RoHS: Yes; ComponentLink1Description: Datasheet; ComponentLink1URL: https://wmsc.lcsc.com/wmsc/upload/file/pdf/v2/lcsc/2304140030_Walsin-Tech-Corp-1206B101K251CT_C237164.pdf; ComponentLink2Description: JLCPCB Part URL; ComponentLink2URL: https://jlcpcb.com/partdetail/C237164; ComponentLink3Description: LCSC Part URL; ComponentLink3URL: https://lcsc.com/product-detail/Multilayer-Ceramic-Capacitors-MLCC---SMD-SMT_Walsin-Tech-Corp-Walsin-Tech-Corp-1206B101K251CT_C237164.html
footprint CAP-1206 (1206 (3216M) Capacitor)
pins: 1, 2

## 1206B101K501CT
designator C?  Capacitance: 100pF  (hidden comment: *)
Capacitor, Ceramic (MLCC), 100pF, ±10%, 500V, X7R, ±10%, SMD 1206; Manufacturer: Walsin Tech Corp; Manufacturer Part Number: 1206B101K501CT; Package Size: 1206; JLCPCB Basic Part: No; JLCPCB Part Number: C303945; Supplier 1: LCSC; Category: Capacitors - MLCC; Supplier Part Number 1: C303945; Tolerance: ±10%; Voltage Rating: 500V; Temperature Coefficient: X7R; RoHS: Yes; ComponentLink1Description: Datasheet; ComponentLink2Description: JLCPCB Part URL; ComponentLink2URL: https://jlcpcb.com/partdetail/C303945; ComponentLink3Description: LCSC Part URL; ComponentLink3URL: https://lcsc.com/product-detail/Multilayer-Ceramic-Capacitors-MLCC---SMD-SMT_Walsin-Tech-Corp-Walsin-Tech-Corp-1206B101K501CT_C303945.html
footprint CAP-1206 (1206 (3216M) Capacitor)
pins: 1, 2

## 1206B102K101CT
designator C?  Capacitance: 1nF  (hidden comment: *)
Capacitor, Ceramic (MLCC), 1nF, ±10%, 100V, X7R, ±10%, SMD 1206; Manufacturer: Walsin Tech Corp; Manufacturer Part Number: 1206B102K101CT; Package Size: 1206; JLCPCB Basic Part: No; JLCPCB Part Number: C396774; Supplier 1: LCSC; Category: Capacitors - MLCC; Supplier Part Number 1: C396774; Tolerance: ±10%; Voltage Rating: 100V; Temperature Coefficient: X7R; RoHS: Yes; ComponentLink1Description: Datasheet; ComponentLink1URL: https://wmsc.lcsc.com/wmsc/upload/file/pdf/v2/lcsc/2304140030_Walsin-Tech-Corp-1206B102K101CT_C396774.pdf; ComponentLink2Description: JLCPCB Part URL; ComponentLink2URL: https://jlcpcb.com/partdetail/C396774; ComponentLink3Description: LCSC Part URL; ComponentLink3URL: https://lcsc.com/product-detail/Multilayer-Ceramic-Capacitors-MLCC---SMD-SMT_Walsin-Tech-Corp-Walsin-Tech-Corp-1206B102K101CT_C396774.html
footprint CAP-1206 (1206 (3216M) Capacitor)
pins: 1, 2

## 1206B102K101NT
designator C?  Capacitance: 1nF  (hidden comment: *)
Capacitor, Ceramic (MLCC), 1nF, ±10%, 100V, X7R, ±10%, SMD 1206; Manufacturer: FH(Guangdong Fenghua Advanced Tech); Manufacturer Part Number: 1206B102K101NT; Package Size: 1206; JLCPCB Basic Part: No; JLCPCB Part Number: C24783; Supplier 1: LCSC; Category: Capacitors - MLCC; Supplier Part Number 1: C24783; Tolerance: ±10%; Voltage Rating: 100V; Temperature Coefficient: X7R; RoHS: Yes; ComponentLink1Description: Datasheet; ComponentLink1URL: https://wmsc.lcsc.com/wmsc/upload/file/pdf/v2/lcsc/2304140030_FH--Guangdong-Fenghua-Advanced-Tech-1206B102K101NT_C24783.pdf; ComponentLink2Description: JLCPCB Part URL; ComponentLink2URL: https://jlcpcb.com/partdetail/C24783; ComponentLink3Description: LCSC Part URL; ComponentLink3URL: https://lcsc.com/product-detail/Multilayer-Ceramic-Capacitors-MLCC---SMD-SMT_FH-Guangdong-Fenghua-Advanced-Tech-FH-Guangdong-Fenghua-Advanced-Tech-1206B102K101NT_C24783.html
footprint CAP-1206 (1206 (3216M) Capacitor)
pins: 1, 2

## 1206B102K102CT
designator C?  Capacitance: 1nF  (hidden comment: *)
Capacitor, Ceramic (MLCC), 1nF, ±10%, 1kV, X7R, ±10%, SMD 1206; Manufacturer: Walsin Tech Corp; Manufacturer Part Number: 1206B102K102CT; Package Size: 1206; JLCPCB Basic Part: No; JLCPCB Part Number: C396775; Supplier 1: LCSC; Category: Capacitors - MLCC; Supplier Part Number 1: C396775; Tolerance: ±10%; Voltage Rating: 1kV; Temperature Coefficient: X7R; RoHS: Yes; ComponentLink1Description: Datasheet; ComponentLink1URL: https://wmsc.lcsc.com/wmsc/upload/file/pdf/v2/lcsc/2111221830_Walsin-Tech-Corp-1206B102K102CT_C396775.pdf; ComponentLink2Description: JLCPCB Part URL; ComponentLink2URL: https://jlcpcb.com/partdetail/C396775; ComponentLink3Description: LCSC Part URL; ComponentLink3URL: https://lcsc.com/product-detail/Multilayer-Ceramic-Capacitors-MLCC---SMD-SMT_Walsin-Tech-Corp-Walsin-Tech-Corp-1206B102K102CT_C396775.html
footprint CAP-1206 (1206 (3216M) Capacitor)
pins: 1, 2

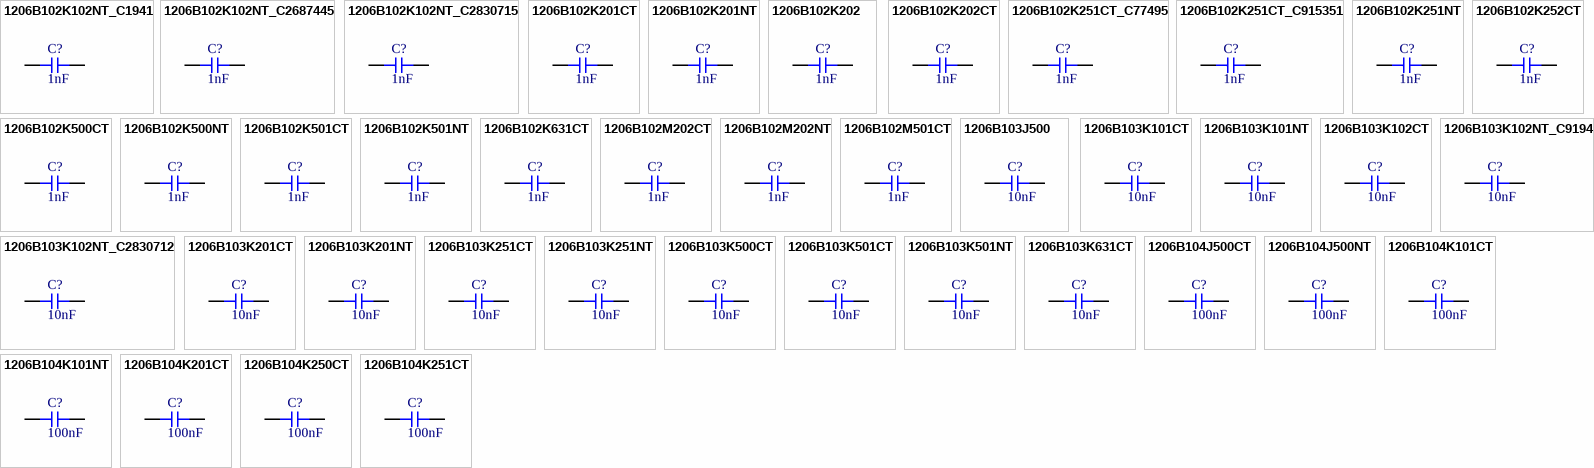
[diagram p1: symbols 1206B102K102NT_C1941 to 1206B104K251CT]

## 1206B102K102NT_C1941
designator C?  Capacitance: 1nF  (hidden comment: *)
Capacitor, Ceramic (MLCC), 1nF, ±10%, 1kV, X7R, ±10%, SMD 1206; Manufacturer: FH(Guangdong Fenghua Advanced Tech); Manufacturer Part Number: 1206B102K102NT; Package Size: 1206; JLCPCB Basic Part: No; JLCPCB Part Number: C1941; Supplier 1: LCSC; Category: Capacitors - MLCC; Supplier Part Number 1: C1941; Tolerance: ±10%; Voltage Rating: 1kV; Temperature Coefficient: X7R; RoHS: Yes; ComponentLink1Description: Datasheet; ComponentLink1URL: https://wmsc.lcsc.com/wmsc/upload/file/pdf/v2/lcsc/2304140030_FH--Guangdong-Fenghua-Advanced-Tech-1206B102K102NT_C1941.pdf; ComponentLink2Description: JLCPCB Part URL; ComponentLink2URL: https://jlcpcb.com/partdetail/C1941; ComponentLink3Description: LCSC Part URL; ComponentLink3URL: https://lcsc.com/product-detail/Multilayer-Ceramic-Capacitors-MLCC---SMD-SMT_FH-Guangdong-Fenghua-Advanced-Tech-FH-Guangdong-Fenghua-Advanced-Tech-1206B102K102NT_C1941.html
footprint CAP-1206 (1206 (3216M) Capacitor)
pins: 1, 2

## 1206B102K102NT_C2687445
designator C?  Capacitance: 1nF  (hidden comment: *)
Capacitor, Ceramic (MLCC), 1nF, ±10%, 1kV, X7R, ±10%, SMD 1206; Manufacturer: FH (Guangdong Fenghua Advanced Tech); Manufacturer Part Number: 1206B102K102NT; Package Size: 1206; JLCPCB Basic Part: No; JLCPCB Part Number: C2687445; Supplier 1: LCSC; Category: Capacitors - MLCC; Supplier Part Number 1: C2687445; Tolerance: ±10%; Voltage Rating: 1kV; Temperature Coefficient: X7R; RoHS: Yes; ComponentLink1Description: Datasheet; ComponentLink1URL: https://wmsc.lcsc.com/wmsc/upload/file/pdf/v2/lcsc/2101221536_FH--Guangdong-Fenghua-Advanced-Tech-1206B102K102NT_C2687445.pdf; ComponentLink2Description: JLCPCB Part URL; ComponentLink2URL: https://jlcpcb.com/partdetail/C2687445; ComponentLink3Description: LCSC Part URL; ComponentLink3URL: https://lcsc.com/product-detail/Multilayer-Ceramic-Capacitors-MLCC---SMD-SMT_FH-Guangdong-Fenghua-Advanced-Tech-FH-Guangdong-Fenghua-Advanced-Tech-1206B102K102NT_C2687445.html
footprint CAP-1206 (1206 (3216M) Capacitor)
pins: 1, 2
